# Altium footprint library MercurialSDR.PcbLib: 74 footprints (part 3 of 5)
Each footprint in its own frame and in the unit in brackets; x right, y up, seen from the top. Pads: shape width x height; smd on the part's side, far side on the other; paste and mask are expansions set on the pad; w line width, h text height; cw(c..) or ccw(c..) is an arc to the next point about the centre after c.
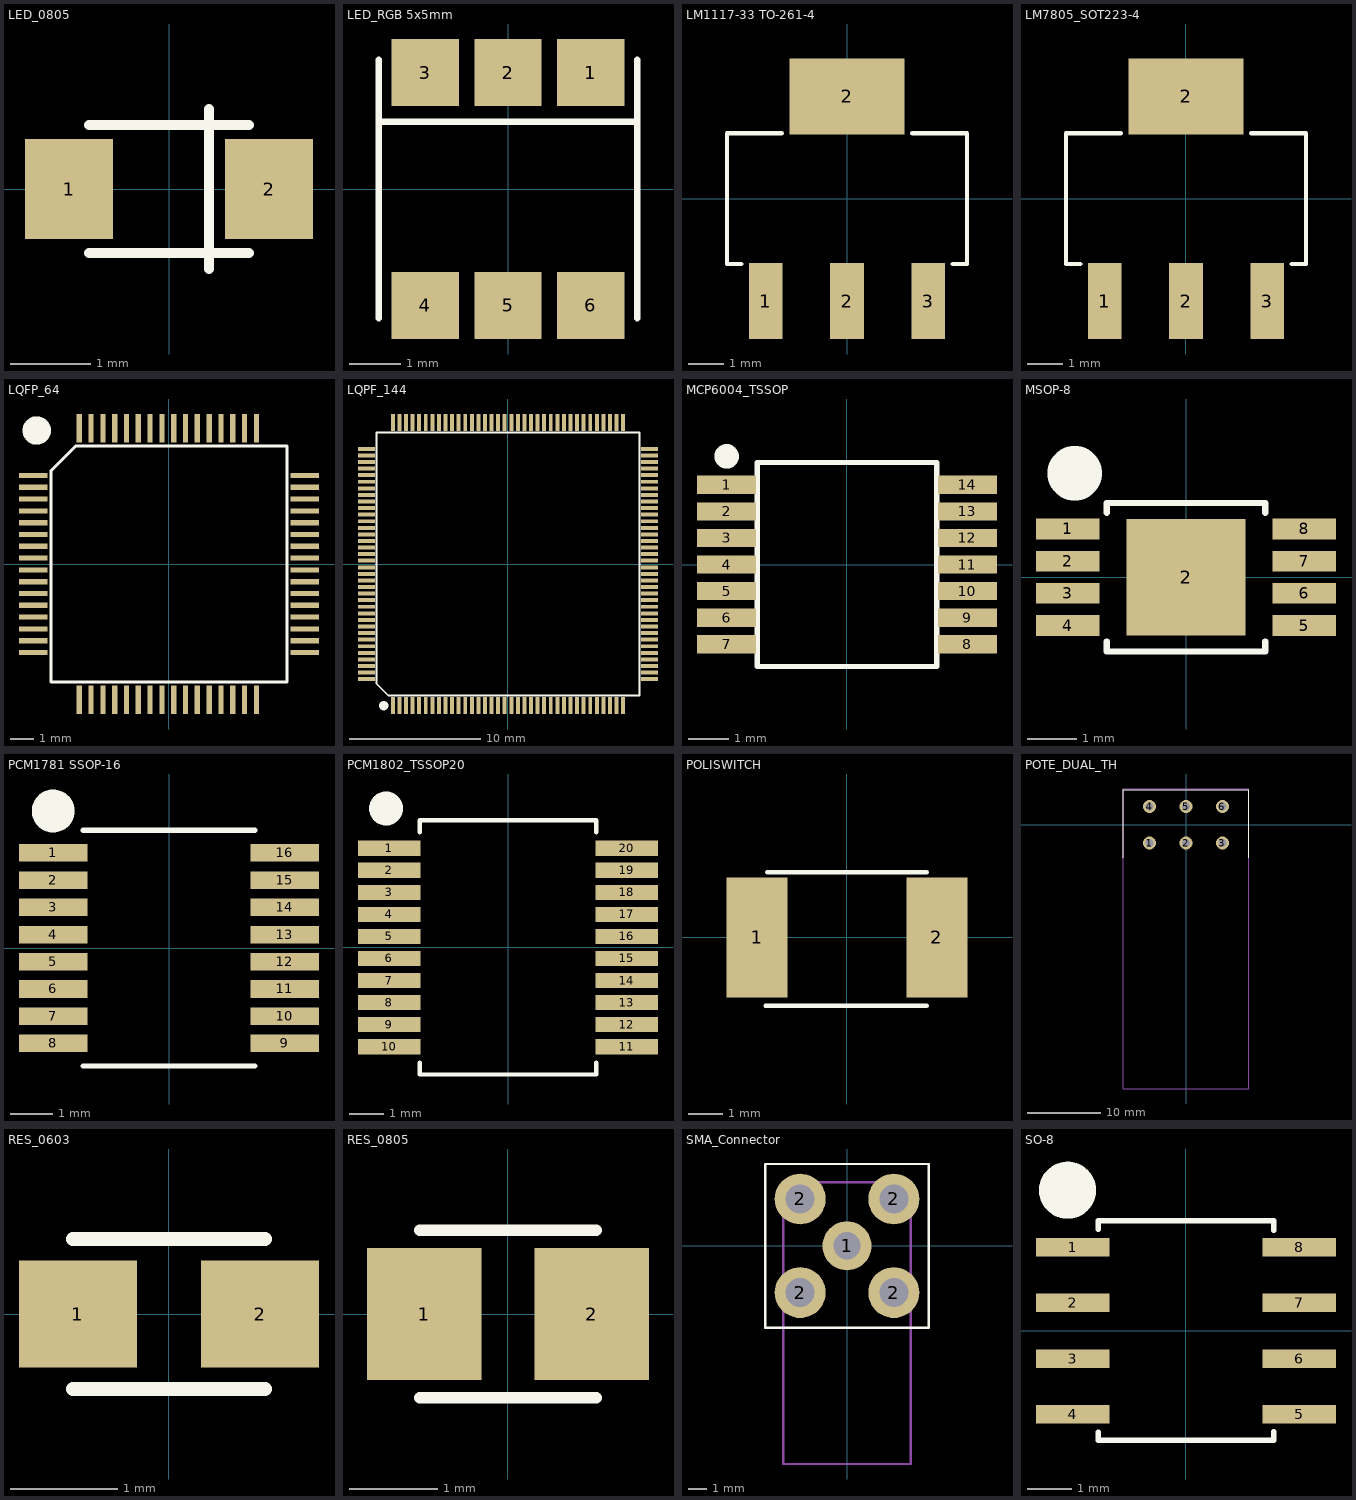
[diagram p2: the footprints below, top view; thin cyan lines are the x and y axes]

## LED_0805 [mm] "Led 0805"
pads (2):
  rect 1.1x1.25 smd: 1(-1.25,0) 2(1.25,0)
Top Overlay:
  lines w0.127: -1,-0.8 1,-0.8 ; -1,0.8 1,0.8 ; 0.5,-1 0.5,1 ; 0.5,-0.75 0.5,0.7
3D body "User Library-LED-0805.step": height 0.9, standoff -0.01, extent -1.05,-0.675 1.05,0.675

## LED_RGB 5x5mm [mm] "Led RGB 5mm x 5mm"
pads (6):
  rect 1.3x1.3 smd: 1(1.6,2.25) 2(0,2.25) 3(-1.6,2.25) 4(-1.6,-2.25) 5(0,-2.25) 6(1.6,-2.25)
Top Overlay:
  lines w0.127: -2.5,-2.5 -2.5,2.5 ; -2.5,1.3 2.5,1.3 ; 2.5,-2.5 2.5,2.5
3D body "User Library-5050 RGB led.STEP": height 1.6, standoff 0, extent -2.45,-2.77 2.65,2.77

## LM1117-33 TO-261-4 [mm] "Regulador Lineal LM1117-33 TO-261-4"
pads (4):
  rect 0.95x2.15 smd: 1(-2.3,-2.9) 2(0,-2.9) 3(2.3,-2.9)
  rect 3.25x2.15 smd: 2(0,2.9)
Top Overlay:
  lines w0.127: -3,-1.85 -3.4,-1.85 -3.4,1.85 -1.85,1.85 ; 1.85,1.85 3.4,1.85 3.4,-1.85 3,-1.85
3D body "User Library- LM1117-SOT-223-1.step": height 1.69, standoff 0.04, extent -3.25,-3.5 3.25,3.5

## LM7805_SOT223-4 [mm] "Regulador Lineal 7805 SOT223-4"
pads (4):
  rect 0.95x2.15 smd: 1(-2.3,-2.9) 2(0,-2.9) 3(2.3,-2.9)
  rect 3.25x2.15 smd: 2(0,2.9)
Top Overlay:
  lines w0.127: -3,-1.85 -3.4,-1.85 -3.4,1.85 -1.85,1.85 ; 1.85,1.85 3.4,1.85 3.4,-1.85 3,-1.85
3D body "User Library- LM1117-SOT-223-1.step": height 1.69, standoff 0.04, extent -3.25,-3.5 3.25,3.5

## LQFP_64 [mm]
pads (64):
  rect 1.2x0.22 smd: 1(-5.75,3.75) 2(-5.75,3.25) 3(-5.75,2.75) 4(-5.75,2.25) 5(-5.75,1.75) 6(-5.75,1.25) 7(-5.75,0.75) 8(-5.75,0.25) 9(-5.75,-0.25) 10(-5.75,-0.75) 11(-5.75,-1.25) 12(-5.75,-1.75) 13(-5.75,-2.25) 14(-5.75,-2.75) 15(-5.75,-3.25) 16(-5.75,-3.75) 33(5.75,-3.75) 34(5.75,-3.25) 35(5.75,-2.75) 36(5.75,-2.25) 37(5.75,-1.75) 38(5.75,-1.25) 39(5.75,-0.75) 40(5.75,-0.25) 41(5.75,0.25) 42(5.75,0.75) 43(5.75,1.25) 44(5.75,1.75) 45(5.75,2.25) 46(5.75,2.75) 47(5.75,3.25) 48(5.75,3.75)
  rect 0.22x1.2 smd: 17(-3.8,-5.75) 18(-3.3,-5.75) 19(-2.8,-5.75) 20(-2.3,-5.75) 21(-1.8,-5.75) 22(-1.3,-5.75) 23(-0.8,-5.75) 24(-0.3,-5.75) 25(0.2,-5.75) 26(0.7,-5.75) 27(1.2,-5.75) 28(1.7,-5.75) 29(2.2,-5.75) 30(2.7,-5.75) 31(3.2,-5.75) 32(3.7,-5.75) 49(3.7,5.75) 50(3.2,5.75) 51(2.7,5.75) 52(2.2,5.75) 53(1.7,5.75) 54(1.2,5.75) 55(0.7,5.75) 56(0.2,5.75) 57(-0.3,5.75) 58(-0.8,5.75) 59(-1.3,5.75) 60(-1.8,5.75) 61(-2.3,5.75) 62(-2.8,5.75) 63(-3.3,5.75) 64(-3.8,5.75)
Top Overlay:
  circle w0.6: c-5.6,5.65 r0.3
  lines w0.127: 3.7,-5 5,-5 5,-3.65 5,5 -3.95,5 -5,3.95 -5,-3.8 -5,-5 3.75,-5
3D body "User Library-LQFP64-2.STEP": height 1.62, standoff -0.01, extent -6.122,-6.072 6.022,6.072

## LQPF_144 [mm] "LQPF_144"
height 0.002
pads (144):
  rect 0.3x1.3 smd: 1(-8.75,-10.75) 2(-8.25,-10.75) 3(-7.75,-10.75) 4(-7.25,-10.75) 5(-6.75,-10.75) 6(-6.25,-10.75) 7(-5.75,-10.75) 8(-5.25,-10.75) 9(-4.75,-10.75) 10(-4.25,-10.75) 11(-3.75,-10.75) 12(-3.25,-10.75) 13(-2.75,-10.75) 14(-2.25,-10.75) 15(-1.75,-10.75) 16(-1.25,-10.75) 17(-0.75,-10.75) 18(-0.25,-10.75) 19(0.25,-10.75) 20(0.75,-10.75) 21(1.25,-10.75) 22(1.75,-10.75) 23(2.25,-10.75) 24(2.75,-10.75) 25(3.25,-10.75) 26(3.75,-10.75) 27(4.25,-10.75) 28(4.75,-10.75) 29(5.25,-10.75) 30(5.75,-10.75) 31(6.25,-10.75) 32(6.75,-10.75) 33(7.25,-10.75) 34(7.75,-10.75) 35(8.25,-10.75) 36(8.75,-10.75) 73(8.75,10.75) 74(8.25,10.75) 75(7.75,10.75) 76(7.25,10.75) 77(6.75,10.75) 78(6.25,10.75) 79(5.75,10.75) 80(5.25,10.75) 81(4.75,10.75) 82(4.25,10.75) 83(3.75,10.75) 84(3.25,10.75) 85(2.75,10.75) 86(2.25,10.75) 87(1.75,10.75) 88(1.25,10.75) 89(0.75,10.75) 90(0.25,10.75) 91(-0.25,10.75) 92(-0.75,10.75) 93(-1.25,10.75) 94(-1.75,10.75) 95(-2.25,10.75) 96(-2.75,10.75) 97(-3.25,10.75) 98(-3.75,10.75) 99(-4.25,10.75) 100(-4.75,10.75) 101(-5.25,10.75) 102(-5.75,10.75) 103(-6.25,10.75) 104(-6.75,10.75) 105(-7.25,10.75) 106(-7.75,10.75) 107(-8.25,10.75) 108(-8.75,10.75)
  rect 1.3x0.3 smd: 37(10.75,-8.75) 38(10.75,-8.25) 39(10.75,-7.75) 40(10.75,-7.25) 41(10.75,-6.75) 42(10.75,-6.25) 43(10.75,-5.75) 44(10.75,-5.25) 45(10.75,-4.75) 46(10.75,-4.25) 47(10.75,-3.75) 48(10.75,-3.25) 49(10.75,-2.75) 50(10.75,-2.25) 51(10.75,-1.75) 52(10.75,-1.25) 53(10.75,-0.75) 54(10.75,-0.25) 55(10.75,0.25) 56(10.75,0.75) 57(10.75,1.25) 58(10.75,1.75) 59(10.75,2.25) 60(10.75,2.75) 61(10.75,3.25) 62(10.75,3.75) 63(10.75,4.25) 64(10.75,4.75) 65(10.75,5.25) 66(10.75,5.75) 67(10.75,6.25) 68(10.75,6.75) 69(10.75,7.25) 70(10.75,7.75) 71(10.75,8.25) 72(10.75,8.75) 109(-10.75,8.75) 110(-10.75,8.25) 111(-10.75,7.75) 112(-10.75,7.25) 113(-10.75,6.75) 114(-10.75,6.25) 115(-10.75,5.75) 116(-10.75,5.25) 117(-10.75,4.75) 118(-10.75,4.25) 119(-10.75,3.75) 120(-10.75,3.25) 121(-10.75,2.75) 122(-10.75,2.25) 123(-10.75,1.75) 124(-10.75,1.25) 125(-10.75,0.75) 126(-10.75,0.25) 127(-10.75,-0.25) 128(-10.75,-0.75) 129(-10.75,-1.25) 130(-10.75,-1.75) 131(-10.75,-2.25) 132(-10.75,-2.75) 133(-10.75,-3.25) 134(-10.75,-3.75) 135(-10.75,-4.25) 136(-10.75,-4.75) 137(-10.75,-5.25) 138(-10.75,-5.75) 139(-10.75,-6.25) 140(-10.75,-6.75) 141(-10.75,-7.25) 142(-10.75,-7.75) 143(-10.75,-8.25) 144(-10.75,-8.75)
Top Overlay:
  lines w0.127: -10,-9.1 -9.1,-10 10,-10 10,10 -10,10 -10,8.75 -10,-9.1
  lines w0.7: -9.451,-10.773 ccw(c-9.75,-10.75) -9.45,-10.75
3D body "User Library-LQFP144_STM32F4.STEP": height 2, standoff 0.1, extent -11,-11 11,11

## MCP6004_TSSOP [mm] "TSSOP de MCP6004"
pads (14):
  rect 1.45x0.45 smd: 1(-2.95,1.95) 2(-2.95,1.3) 3(-2.95,0.65) 4(-2.95,0) 5(-2.95,-0.65) 6(-2.95,-1.3) 7(-2.95,-1.95) 8(2.95,-1.95) 9(2.95,-1.3) 10(2.95,-0.65) 11(2.95,0) 12(2.95,0.65) 13(2.95,1.3) 14(2.95,1.95)
Top Overlay:
  circle w0.5: c-2.95,2.65 r0.05
  lines w0.127: -2.2,-2.5 2.2,-2.5 2.2,2.5 -2.2,2.5 -2.2,-2.5
3D body "User Library-TSSOP-14.STEP": height 1.2, standoff 0, extent -3.15,-2.5 3.25,2.5

## MSOP-8 [mm]
pads (9):
  rect 1.28x0.42 smd: 1(-2.39,0.975) 2(-2.39,0.325) 3(-2.39,-0.325) 4(-2.39,-0.975) 5(2.39,-0.975) 6(2.39,-0.325) 7(2.39,0.325) 8(2.39,0.975)
  rect 2.4x2.35 smd: 2(0,0)
Top Overlay:
  circle w1: c-2.25,2.1 r0.05
  lines w0.127: -1.6,-1.3 -1.6,-1.5 1.6,-1.5 1.6,-1.3 ; -1.6,1.3 -1.6,1.5 1.6,1.5 1.6,1.3
3D body "User Library-MSOP8.step": height 1, standoff -0.1, extent -2.469,-1.55 2.469,1.55

## PCM1781 SSOP-16 [mm] "DAC PCM1781 SSOP-16"
pads (16):
  rect 1.6x0.41 smd: 1(-2.7,2.222) 2(-2.7,1.587) 3(-2.7,0.953) 4(-2.7,0.318) 5(-2.7,-0.318) 6(-2.7,-0.953) 7(-2.7,-1.587) 8(-2.7,-2.222) 9(2.7,-2.222) 10(2.7,-1.587) 11(2.7,-0.953) 12(2.7,-0.318) 13(2.7,0.318) 14(2.7,0.953) 15(2.7,1.587) 16(2.7,2.222)
Top Overlay:
  circle w0.5: c-2.7,3.2 r0.25
  lines w0.127: -2,-2.75 2,-2.75 ; -2,2.75 2,2.75
3D body "User Library-ssop-16 pos.step": height 0.5, standoff -0.6, extent -2.997,-2.467 2.997,2.512

## PCM1802_TSSOP20 [mm] "ADC PCM1802 TSSOP20"
pads (20):
  rect 1.85x0.45 smd: 1(-3.5,2.925) 2(-3.5,2.275) 3(-3.5,1.625) 4(-3.5,0.975) 5(-3.5,0.325) 6(-3.5,-0.325) 7(-3.5,-0.975) 8(-3.5,-1.625) 9(-3.5,-2.275) 10(-3.5,-2.925) 11(3.5,-2.925) 12(3.5,-2.275) 13(3.5,-1.625) 14(3.5,-0.975) 15(3.5,-0.325) 16(3.5,0.325) 17(3.5,0.975) 18(3.5,1.625) 19(3.5,2.275) 20(3.5,2.925)
Top Overlay:
  circle w0.5: c-3.6,4.1 r0.25
  lines w0.127: -2.6,-3.4 -2.6,-3.75 2.6,-3.75 2.6,-3.4 ; -2.6,3.4 -2.6,3.75 2.6,3.75 2.6,3.4
3D body "User Library-TSSOP20_TP.STEP": height 1.1, standoff -0.09, extent -3.18,-3.35 3.1,3.15

## POLISWITCH [mm] "Poliswitch 0ZCG0125AF2B"
pads (2):
  rect 1.78x3.5 smd: 1(-2.625,0) 2(2.625,0)
Top Overlay:
  lines w0.127: -2.375,-2 2.325,-2 ; -2.325,1.9 2.325,1.9
3D body "User Library-Poliswitch_0ZCG-1_35mm_V2.step": height 1.55, standoff 0, extent -2.39,-1.705 2.34,1.705

## POTE_DUAL_TH [mm] "Potenciometro Dual Through Hole"
pads (6):
  round 1.8 hole 1.1 unplated: 1(-5,-2.5) 2(0,-2.5) 3(5,-2.5) 4(-5,2.5) 5(0,2.5) 6(5,2.5)
Top Overlay:
  lines w0.127: -8.6,-4.5 -8.6,4.8 8.6,4.8 8.6,-4.5
Mechanical 15:
  lines w0.127: -8.6,-36.2 -8.6,4.9 8.6,4.9 8.6,-36.2 -8.6,-36.2
3D body "User Library-PotenciometroDual.step": height 21.5, standoff -3, extent -8.5,-36.1 8.5,4.75

## RES_0603 [mm] "Resistor SMD 0603"
pads (2):
  rect 1.1x1 smd: 1(-0.85,0) 2(0.85,0)
Top Overlay:
  lines w0.127: -0.9,-0.7 0.9,-0.7 ; -0.9,0.7 0.9,0.7
3D body "User Library-RES_2013-0603.step": height 0.3, standoff 0, extent -0.8,-0.4 0.8,0.4

## RES_0805 [mm] "Resistor SMD 0805"
pads (2):
  rect 1.3x1.5 smd: 1(-0.95,0) 2(0.95,0)
Top Overlay:
  lines w0.127: -1,-0.95 1,-0.95 ; -1,0.95 1,0.95
3D body "User Library-RES_2013-0805.step": height 0.76, standoff 0, extent -1.15,-0.675 1.15,0.675

## SMA_Connector [mm] "Conector SMA"
pads (5):
  round 2.7 hole 1.5: 1(0,0)
  round 2.8 hole 1.6: 2(-2.575,-2.575) 2(-2.575,2.575) 2(2.575,-2.575) 2(2.575,2.575)
Top Overlay:
  lines w0.127: -4.5,-4.5 -4.5,4.5 -4,4.5 4,4.5 4.5,4.5 4.5,-4.5 -4.5,-4.5
Mechanical 15:
  lines w0.127: -3.5,-12 -3.5,-4.5 -3.5,3.5 3.5,3.5 3.5,-12 -3.5,-12
3D body "SMA2.stp": height 10.17, standoff -3.33, extent -3.175,-11.574 3.175,3.226

## SO-8 [mm] "SO-8"
pads (8):
  rect 1.67x0.42 smd: 1(-2.582,1.905) 2(-2.582,0.635) 3(-2.582,-0.635) 4(-2.582,-1.905) 5(2.583,-1.905) 6(2.583,-0.635) 7(2.583,0.635) 8(2.583,1.905)
Top Overlay:
  circle w0.7: c-2.7,3.2 r0.3
  lines w0.127: -2,-2.31 -2,-2.5 2,-2.5 2,-2.3 ; -2,2.31 -2,2.5 2,2.5 2,2.29
3D body "User Library-A5972D013TR-so8.STEP": height 1.45, standoff 0, extent -2.903,-2.448 2.876,2.454